# Altium footprint library passive.PcbLib: 73 footprints (part 4 of 5)
Each footprint in its own frame and in the unit in brackets; x right, y up, seen from the top. Pads: shape width x height; smd on the part's side, far side on the other; paste and mask are expansions set on the pad; w line width, h text height; cw(c..) or ccw(c..) is an arc to the next point about the centre after c.
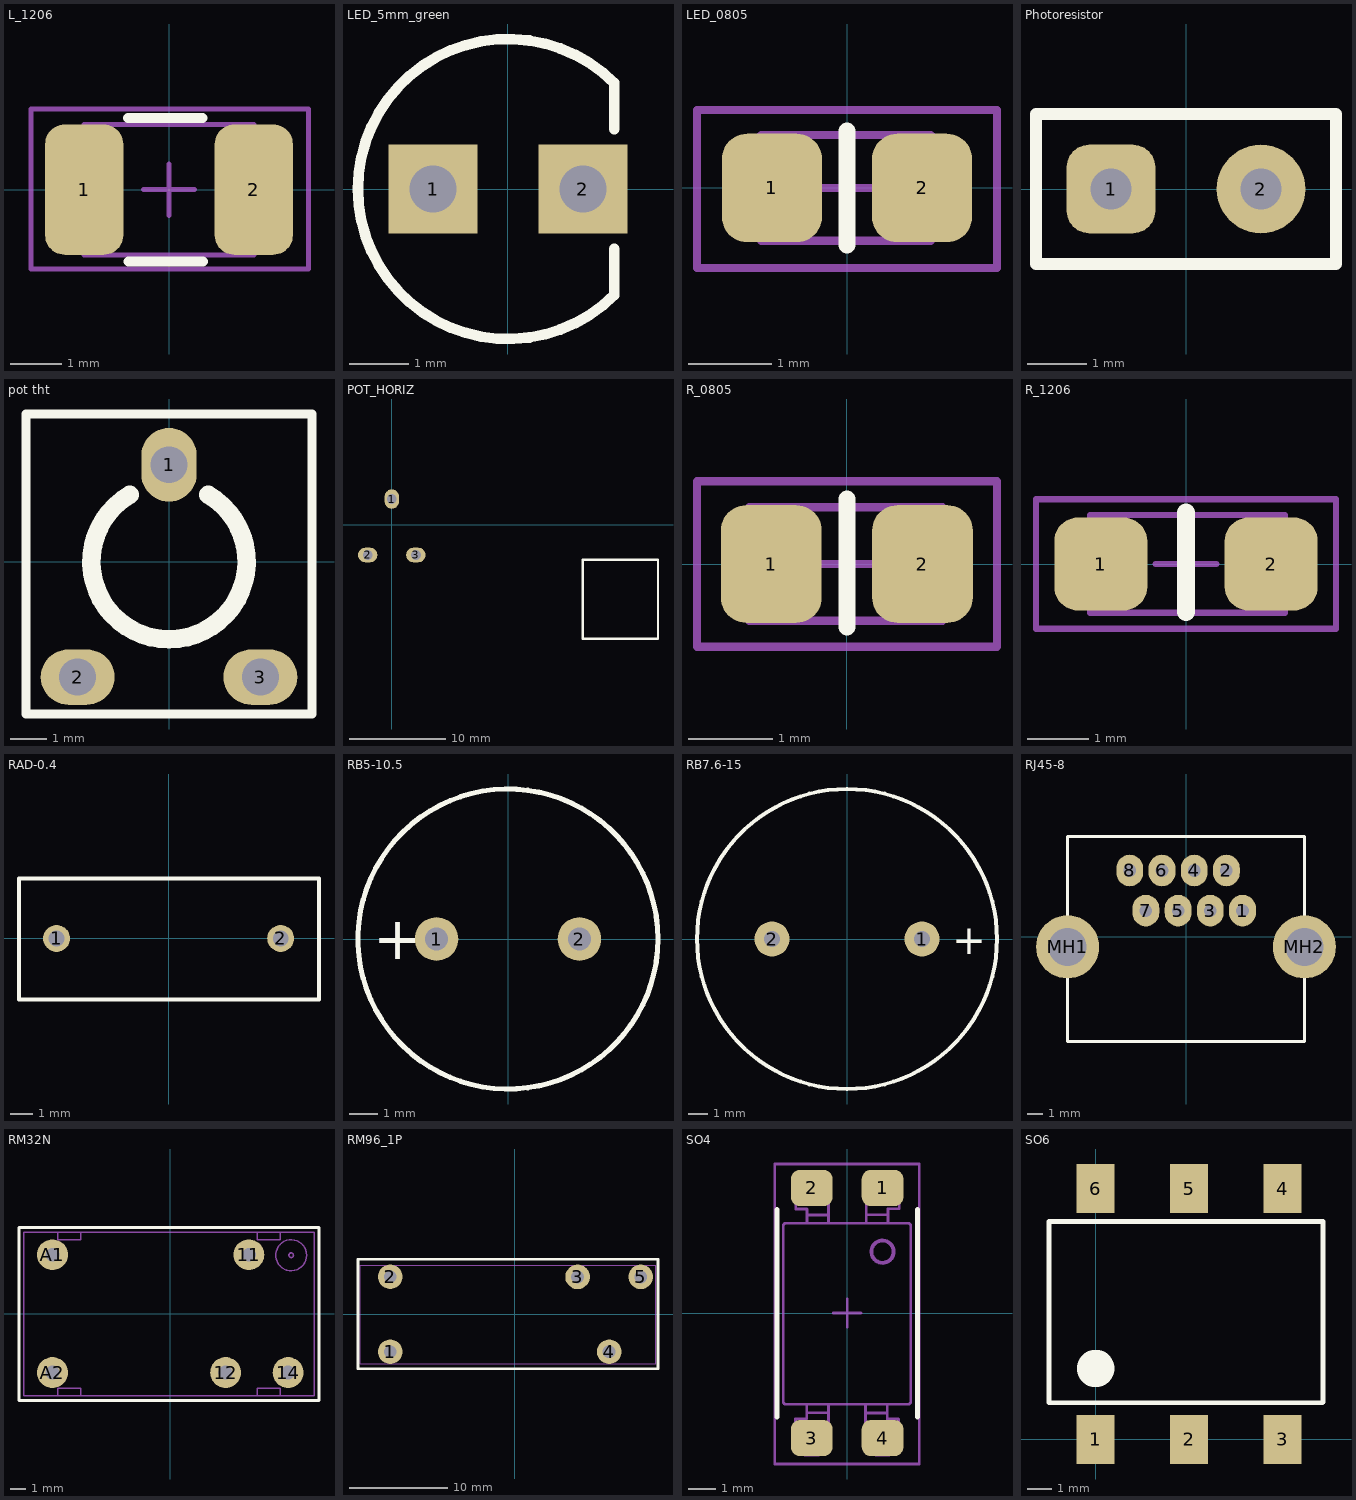
[diagram p3: the footprints below, top view; thin cyan lines are the x and y axes]

## L_1206 [mil]
pads (2):
  rrect50% 60x100 smd: 1(-65,0) 2(65,0)
Top Overlay:
  lines w7.87: -31.5,55 25.5,55 ; -31,-55 26,-55
Mechanical 13:
  lines w3.94: -65,-50 -65,50 65,50 65,-50 -65,-50
  text ".Value" at -37,-8 h19.68
  text ".Designator" at -74.17,66.14 h19.68
Mechanical 15:
  lines w3.94: -19.68,0 19.69,0 ; 0,-19.68 0,19.69 ; -105.81,-60.81 -105.81,61.81 106.81,61.81 106.81,-60.81 -105.81,-60.81
3D body "User Library-Chip Inductor.step": height 53.15, standoff 0, extent -62.99,-49.22 62.99,49.21

## LED_5mm_green [mm]
pads (2):
  rect 1.5x1.5 hole 0.8 unplated paste-10: 1(-1.27,0) 2(1.27,0)
Top Overlay:
  lines w0.18: 1.796,-1.016 1.796,-1.796 cw(c0,0) 1.796,1.796 ; 1.796,1.016 1.796,1.778
3D body "User Library-LED-D5G.step": height 9.2, standoff -6.25, extent -3,-3 2.5,3

## LED_0805 [mm] "LED; SMD; 0805;"
height 0.7
pads (2):
  rrect50% 1.2x1.3 smd: 1(-0.9,0) 2(0.9,0)
Top Overlay:
  lines w0.2: 0,-0.686 0,0.686
Mechanical 13:
  lines w0.1: -1.027,-0.635 1.005,-0.635 1.005,0.635 -1.027,0.635 -1.027,-0.635
  text ".Value" at -0.914,-0.152 h0.5
  text ".Designator" at -1.702,0.94 h0.5
Mechanical 15:
  lines w0.1: -0.5,0 0.5,0 ; 0,-0.5 0,0.5 ; -1.799,-0.96 1.799,-0.96 1.799,0.935 -1.799,0.935 -1.799,-0.96
3D body "User Library-KP-2012.step": height 1.1, standoff 0, extent -1.001,-0.625 1.001,0.625

## Photoresistor [mm]
pads (2):
  rrect50% 1.5x1.5 hole 0.7: 1(-1.27,0)
  round 1.5 hole 0.7: 2(1.27,0)
Top Overlay:
  lines w0.2: -2.54,-1.27 -2.54,1.27 2.54,1.27 2.54,-1.27 -2.54,-1.27

## pot tht [mil]
pads (3):
  oval 60x80 hole 40: 1(0,105)
  oval 80x60 hole 40: 2(-99,-125) 3(99,-125)
Top Overlay:
  lines w10: -155,-165 -155,160 155,160 155,-165 -155,-165
  lines w20: -42.5,72.55 ccw(c0,0) 42.5,72.55
3D body: height 197.24, standoff 0, extent -57.58,-58.93 60.06,58.94
3D body: height 196.85, standoff 0, extent -150,-150 150,150

## POT_HORIZ [mil]
pads (3):
  oval 60x80 hole 40: 1(0,105)
  oval 80x60 hole 40: 2(-99,-125) 3(99,-125)
Top Overlay:
  lines w10: 784,-469 1094,-469 1094,-144 784,-144 784,-469
3D body "User Library-Trimming Potentiometer Horizontal 3296P 203 - 20k.step": height 95.08, standoff -419.09, extent -162.19,-109.94 213,347.94

## R_0805 [mm] "Chip Resistor, Body 2.0x1.2mm, IPC Medium Density"
height 0.7
pads (2):
  rrect50% 1.2x1.4 smd: 1(-0.9,0) 2(0.9,0)
Top Overlay:
  lines w0.2: 0,-0.75 0,0.774
Mechanical 13:
  lines w0.1: -1.161,-0.675 -1.161,0.675 1.139,0.675 1.139,-0.675 -1.161,-0.675
  text ".Value" at -0.94,-0.229 h0.5
  text ".Designator" at -1.63,0.969 h0.5
Mechanical 15:
  lines w0.1: -0.5,0 0.5,0 ; 0,-0.5 0,0.5 ; -1.784,-0.986 1.788,-0.986 1.788,0.986 -1.784,0.986 -1.784,-0.986
3D body "User Library-RES_2013-0805.STEP": height 0.76, standoff 0, extent -1.161,-0.675 1.139,0.675

## R_1206 [mil]
pads (2):
  rrect50% 60x60 smd: 1(-55,0) 2(55,0)
Top Overlay:
  lines w11.81: 0,-31 0,33
Mechanical 13:
  lines w3.94: -61.99,-31.49 -61.99,31.5 -61,31.5 64,31.5 64,-31.49 -61.99,-31.49
  text ".Value" at -38,-7 h19.68
  text ".Designator" at -65.17,44.14 h19.68
Mechanical 15:
  lines w3.94: -19.68,0 19.69,0 ; 0,-19.68 0,19.69 ; -96.81,-41.81 96.81,-41.81 96.81,41.81 -96.81,41.81 -96.81,-41.81
3D body "User Library-RESC3216X06N.step": height 21.69, standoff 0, extent -61.99,-31.49 64,31.5

## RAD-0.4 [mm] "Radial Cap, Thru-Hole; 2 Leads; 0.4 in Pin Spacing"
pads (2):
  round 1.2 hole 0.7: 1(-5,0) 2(5,0)
Top Overlay:
  lines w0.18: -6.676,-2.718 6.709,-2.718 6.709,2.667 -6.676,2.667 -6.676,-2.718
Mechanical 13:
  text ".Value" at -0.914,-0.152 h0.5
  text ".Designator" at -6.57,2.886 h0.5
3D body "75186.stp": height 12.25, standoff -4.75, extent -6.592,-2.601 6.608,2.601

## RB5-10.5 [mm] "Capacitor (Radial); 2 Leads"
pads (2):
  round 1.524 hole 0.8: 1(-2.5,0) 2(2.5,0)
Top Overlay:
  circle w0.18: c0,0 r5.25
  text "+" at -4.724,-0.711 h1.5
Mechanical 1:
  circle w0.02: c0,0 r5.25
3D body "User Library-CE_R200_D400_H800.step": height 20.32, standoff -2.9, extent -5.08,-5.079 5.08,5.08

## RB7.6-15 [mil] "Polarized Capacitor (Radial); 2 Leads"
pads (2):
  round 70 hole 31.5: 1(150,0) 2(-150,0)
Top Overlay:
  circle w7.87: c0,0 r300
  text "+" at 210,-30 h59.06

## RJ45-8 [mm]
pads (10):
  oval 1.7x2 hole 0.8: 1(3.555,1.671) 2(2.535,4.211) 3(1.515,1.671) 4(0.495,4.211) 5(-0.525,1.671) 6(-1.545,4.211) 7(-2.565,1.671) 8(-3.585,4.211)
  round 4 hole 2.4 unplated: MH1(-7.525,-0.629) MH2(7.475,-0.629)
Top Overlay:
  lines w0.2: -7.525,-2.229 -7.525,-6.629 7.475,-6.629 7.475,-2.229 ; -7.525,0.971 -7.525,6.371 7.475,6.371 7.475,0.971
Mechanical 13:
  lines w0.1: -7.525,-6.629 7.475,-6.629 7.475,6.371 -7.525,6.371 -7.525,-6.629
3D body: height 14.5, standoff 0, extent -7.525,-6.629 7.475,6.371

## RM32N [mm]
height 15.3
pads (5):
  round 2 hole 0.9: 11(5.08,3.81) 12(3.58,-3.81) 14(7.62,-3.81) A1(-7.62,3.81) A2(-7.62,-3.81)
Top Overlay:
  lines w0.2: -9.785,-5.623 9.615,-5.623 9.615,5.577 -9.785,5.577 -9.785,-5.623
Mechanical 13:
  circle w0.1: c7.815,-3.823 r0.5
  circle w0.1: c7.815,3.777 r1
  circle w0.1: c7.815,3.777 r0.15
  lines w0.1: -9.785,-5.623 -9.485,-5.623 ; -7.775,-4.023 -7.475,-4.023 ; -7.775,-3.623 -7.475,-3.623 ; -7.775,3.577 -7.475,3.577 ; -7.775,3.977 -7.475,3.977 ; -7.285,-5.323 -7.285,-4.823 -5.785,-4.823 -5.785,-5.323 ; -7.285,5.277 -7.285,4.777 -5.785,4.777 -5.785,5.277 ; 3.425,-4.023 3.725,-4.023 ; 3.425,-3.623 3.725,-3.623 ; 4.925,3.577 5.225,3.577 ; 4.925,3.977 5.225,3.977 ; 5.615,-5.323 5.615,-4.823 7.115,-4.823 7.115,-5.323 ; 5.615,5.277 5.615,4.777 7.115,4.777 7.115,5.277 ; 7.465,-4.023 7.765,-4.023 ; 7.465,-3.623 7.765,-3.623 ; 9.615,5.277 9.615,5.577 ; -9.485,-5.323 -9.485,5.277 9.315,5.277 9.315,-5.323 -9.485,-5.323 ; -7.775,-4.223 -7.475,-4.223 -7.475,-3.423 -7.775,-3.423 -7.775,-4.223 ; -7.775,3.377 -7.475,3.377 -7.475,4.177 -7.775,4.177 -7.775,3.377 ; 3.425,-4.223 3.725,-4.223 3.725,-3.423 3.425,-3.423 3.425,-4.223 ; 4.925,3.377 5.225,3.377 5.225,4.177 4.925,4.177 4.925,3.377 ; 7.465,-4.223 7.765,-4.223 7.765,-3.423 7.465,-3.423 7.465,-4.223
Mechanical 15:
  lines w0.1: -9.785,-5.623 9.615,-5.623 9.615,5.577 -9.785,5.577 -9.785,-5.623
3D body "RM32N.STEP": height 15.3, standoff -3.8, extent -9.485,-5.323 9.315,5.277

## RM96_1P [mm] "RM96 miniature relay"
height 16.2
pads (5):
  round 2.5 hole 1.3: 1(-12.6,-3.81) 2(-12.6,3.81) 3(6.4,3.79) 4(9.6,-3.81) 5(12.8,3.79)
Top Overlay:
  lines w0.254: -15.875,-5.537 14.554,-5.537 14.554,5.588 -15.875,5.588 -15.875,-5.537
Mechanical 13:
  lines w0.1: -15.672,-5.029 -15.672,4.971 14.328,4.971 14.328,-5.029 -15.672,-5.029
  text ".Designator" at -15.794,-5.699 h0.5
  text ".Value" at -0.991,-0.203 h0.5
3D body "RM96 1P.STEP": height 15.8, standoff -3.8, extent -15.672,-5.029 14.328,4.971

## SO4 [mm]
pads (4):
  rrect50% 1.5x1.3 smd: 1(1.27,4.485) 2(-1.27,4.485) 3(-1.27,-4.485) 4(1.27,-4.485)
Top Overlay:
  lines w0.18: -2.515,-3.723 -2.515,3.719 ; 2.515,-3.723 2.515,3.719
Mechanical 13:
  circle w0.1: c1.267,2.201 r0.38
  circle w0.1: c1.267,2.201 r0.42
  circle w0.1: c1.267,2.201 r0.4
  lines w0.1: -2.197,3.223 ccw(c-2.195,3.122) -2.296,3.124 -2.296,-3.174 ccw(c-2.195,-3.173) -2.197,-3.274 2.183,-3.274 ccw(c2.181,-3.173) 2.282,-3.174 2.282,3.124 ccw(c2.181,3.122) 2.183,3.223 -2.192,3.223 ; -1.453,-3.284 -1.453,-3.794 -1.853,-3.794 -1.853,-4.005 -1.523,-4.335 -1.523,-5.089 -1.023,-5.089 -1.023,-4.339 -0.673,-3.989 -0.673,-3.291 ; -1.449,-3.579 -0.673,-3.579 ; -1.446,3.225 -1.446,3.736 -1.846,3.736 -1.846,3.946 -1.516,4.276 -1.516,5.031 -1.016,5.031 -1.016,4.28 -0.666,3.93 -0.666,3.229 ; -1.442,3.52 -0.666,3.52 ; 0.661,-3.581 1.437,-3.581 ; 0.661,-3.28 0.661,-3.991 1.011,-4.341 1.011,-5.091 1.511,-5.091 1.511,-4.337 1.841,-4.007 1.841,-3.796 1.441,-3.796 1.441,-3.286 ; 0.687,3.225 0.687,3.932 1.038,4.282 1.038,5.033 1.538,5.033 1.538,4.278 1.867,3.948 1.867,3.738 1.468,3.738 1.468,3.229 ; 0.687,3.522 1.464,3.522
  text ".Comment" at -1.676,-0.152 h0.5
  text ".Designator" at -1.808,5.475 h0.5
Mechanical 15:
  lines w0.1: -0.5,0 0.5,0 ; 0,-0.5 0,0.5 ; -2.596,-5.415 2.583,-5.415 2.583,5.346 -2.596,5.346 -2.596,-5.415
3D body "User Library-EL817.step": height 4.67, standoff -0.01, extent -2.296,-5.115 2.283,5.046

## SO6 [mm]
pads (6):
  rect 1.55x2 smd: 1(0,0) 2(3.81,0) 3(7.62,0) 4(7.62,10.236) 5(3.81,10.236) 6(0,10.236)
Top Overlay:
  circle w1.27: c0,2.897 r0.127
  lines w0.2: 9.245,8.89 -1.905,8.89 -1.905,1.5 9.245,1.5 9.271,1.526 9.271,8.89